# Altium footprint library myPcbLib.PcbLib: 987 footprints (part 2 of 62)
Each footprint in its own frame and in the unit in brackets; x right, y up, seen from the top. Pads: shape width x height; smd on the part's side, far side on the other; paste and mask are expansions set on the pad; w line width, h text height; cw(c..) or ccw(c..) is an arc to the next point about the centre after c.
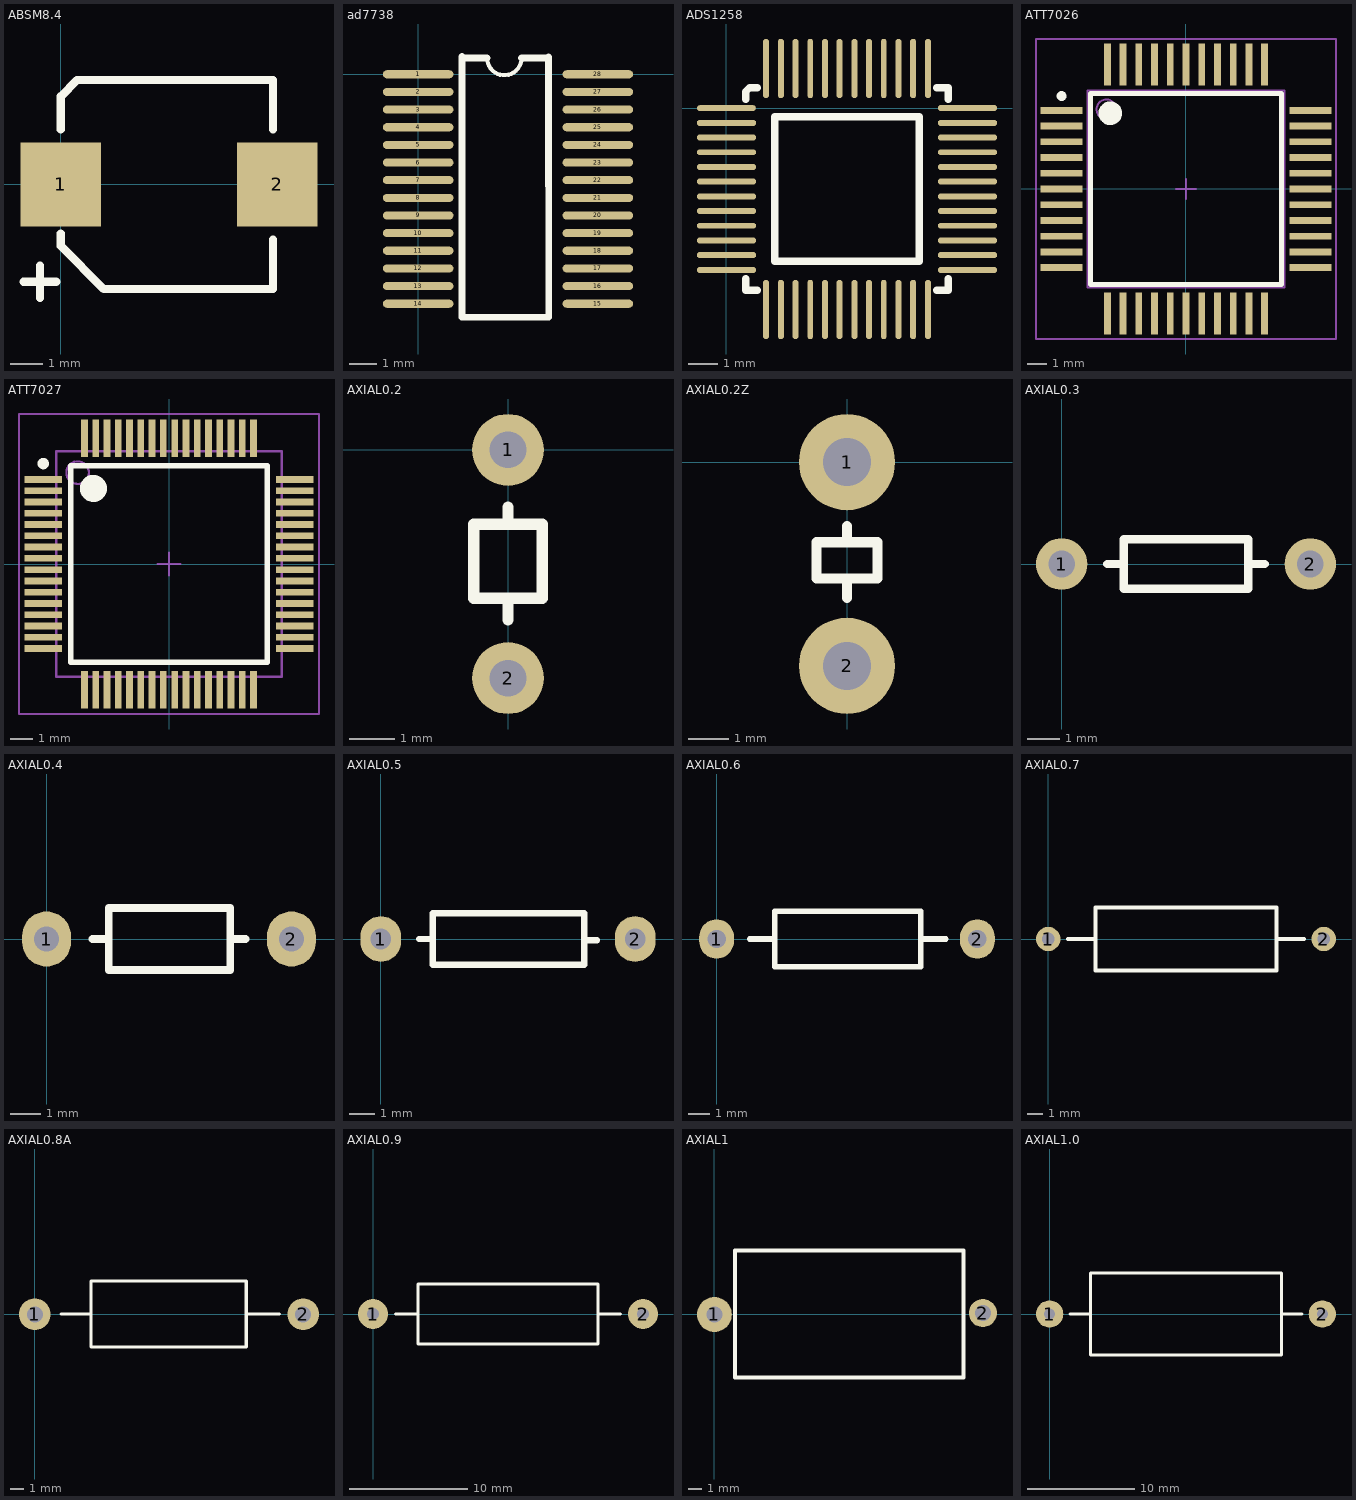
[diagram p1: the footprints below, top view; thin cyan lines are the x and y axes]

## ABSM8.4 [mm]
pads (2):
  rect 2.5x2.6 smd: 1(0,0) 2(6.731,0)
Top Overlay:
  lines w0.254: -1.156,-3.023 -0.648,-3.023 ; -0.648,-3.531 -0.648,-3.023 ; -0.648,-2.515 -0.648,-3.023 ; -0.14,-3.023 -0.648,-3.023 ; 0,-1.524 0,-1.917 1.333,-3.25 6.604,-3.25 6.604,-1.714 ; 0,1.714 0,2.742 0.508,3.25 6.604,3.25 6.604,1.714

## ad7738 [mm]
pads (28):
  oval 2.6x0.3 smd: 1(0,0) 2(0,-0.65) 3(0,-1.3) 4(0,-1.95) 5(0,-2.6) 6(0,-3.25) 7(0,-3.9) 8(0,-4.55) 9(0,-5.2) 10(0,-5.85) 11(0,-6.5) 12(0,-7.15) 13(0,-7.8) 14(0,-8.45) 15(6.616,-8.45) 16(6.616,-7.8) 17(6.616,-7.15) 18(6.616,-6.5) 19(6.616,-5.85) 20(6.616,-5.2) 21(6.616,-4.55) 22(6.616,-3.9) 23(6.616,-3.25) 24(6.616,-2.6) 25(6.616,-1.95) 26(6.616,-1.3) 27(6.616,-0.65) 28(6.616,0)
Top Overlay:
  lines w0.15: 2.538,0.6 ccw(c3.173,0.6) 3.808,0.6
  lines w0.254: 1.608,0.65 1.608,-8.95 4.808,-8.95 4.799,0.635 ; 1.658,0.6 2.538,0.6 ; 3.808,0.6 4.764,0.6

## ADS1258 [mm]
pads (48):
  oval 2x0.2 smd: 1(0,0)
  oct 2x0.2 smd: 2(0,-0.5) 3(0,-1) 4(0,-1.5) 5(0,-2) 6(0,-2.5) 7(0,-3) 8(0,-3.5) 9(0,-4) 10(0,-4.5) 11(0,-5) 12(0,-5.5) 25(8.2,-5.5) 26(8.2,-5) 27(8.2,-4.5) 28(8.2,-4) 29(8.2,-3.5) 30(8.2,-3) 31(8.2,-2.5) 32(8.2,-2) 33(8.2,-1.5) 34(8.2,-1) 35(8.2,-0.5) 36(8.2,0)
  oct 0.2x2 smd: 13(1.35,-6.85) 14(1.85,-6.85) 15(2.35,-6.85) 16(2.85,-6.85) 17(3.35,-6.85) 18(3.85,-6.85) 19(4.35,-6.85) 20(4.85,-6.85) 21(5.35,-6.85) 22(5.85,-6.85) 23(6.35,-6.85) 24(6.85,-6.85) 37(6.85,1.35) 38(6.35,1.35) 39(5.85,1.35) 40(5.35,1.35) 41(4.85,1.35) 42(4.35,1.35) 43(3.85,1.35) 44(3.35,1.35) 45(2.85,1.35) 46(2.35,1.35) 47(1.85,1.35) 48(1.35,1.35)
Top Overlay:
  lines w0.254: 0.65,-5.8 0.65,-6.2 1.05,-6.2 ; 0.65,0.3 0.65,0.55 0.8,0.7 1.05,0.7 ; 7.15,-6.2 7.55,-6.2 7.55,-5.8 ; 7.15,0.7 7.55,0.7 7.55,0.3 ; 1.65,-5.2 6.55,-5.2 6.55,-0.3 1.65,-0.3 1.65,-5.2

## ATT7026 [mm] "QFP, 44-Leads, Body 14.0x14.0mm (max), Pitch 0.80mm, IPC Medium Density"
height 2.7
pads (44):
  rect 2.15x0.35 smd: 1(-6.325,4) 2(-6.325,3.2) 3(-6.325,2.4) 4(-6.325,1.6) 5(-6.325,0.8) 6(-6.325,0) 7(-6.325,-0.8) 8(-6.325,-1.6) 9(-6.325,-2.4) 10(-6.325,-3.2) 11(-6.325,-4) 23(6.325,-4) 24(6.325,-3.2) 25(6.325,-2.4) 26(6.325,-1.6) 27(6.325,-0.8) 28(6.325,0) 29(6.325,0.8) 30(6.325,1.6) 31(6.325,2.4) 32(6.325,3.2) 33(6.325,4)
  rect 0.35x2.15 smd: 12(-4,-6.325) 13(-3.2,-6.325) 14(-2.4,-6.325) 15(-1.6,-6.325) 16(-0.8,-6.325) 17(0,-6.325) 18(0.8,-6.325) 19(1.6,-6.325) 20(2.4,-6.325) 21(3.2,-6.325) 22(4,-6.325) 34(4,6.325) 35(3.2,6.325) 36(2.4,6.325) 37(1.6,6.325) 38(0.8,6.325) 39(0,6.325) 40(-0.8,6.325) 41(-1.6,6.325) 42(-2.4,6.325) 43(-3.2,6.325) 44(-4,6.325)
Top Overlay:
  circle w0.6: c-3.85,3.85 r0.3
  circle w0.25: c-6.325,4.725 r0.125
  lines w0.254: -4.85,-4.85 4.85,-4.85 4.85,4.85 -4.85,4.85 -4.85,-4.85
Mechanical 13:
  circle w0.1: c-4.05,4.05 r0.5
  lines w0.1: -5,-5 5,-5 5,5 -5,5 -5,-5
Mechanical 15:
  lines w0.1: -0.5,0 0.5,0 ; 0,-0.5 0,0.5 ; -7.625,-7.625 7.625,-7.625 7.625,7.625 -7.625,7.625 -7.625,-7.625
3D body: height 2.7, standoff 0.1, extent -5,-5 5,5

## ATT7027 [mm] "TSQFP, 64-Leads, Body 12.0x12.0mm (max), Pitch 0.50mm, IPC Medium Density"
height 1.6
pads (64):
  rect 1.65x0.3 smd: 1(-5.575,3.75) 2(-5.575,3.25) 3(-5.575,2.75) 4(-5.575,2.25) 5(-5.575,1.75) 6(-5.575,1.25) 7(-5.575,0.75) 8(-5.575,0.25) 9(-5.575,-0.25) 10(-5.575,-0.75) 11(-5.575,-1.25) 12(-5.575,-1.75) 13(-5.575,-2.25) 14(-5.575,-2.75) 15(-5.575,-3.25) 16(-5.575,-3.75) 33(5.575,-3.75) 34(5.575,-3.25) 35(5.575,-2.75) 36(5.575,-2.25) 37(5.575,-1.75) 38(5.575,-1.25) 39(5.575,-0.75) 40(5.575,-0.25) 41(5.575,0.25) 42(5.575,0.75) 43(5.575,1.25) 44(5.575,1.75) 45(5.575,2.25) 46(5.575,2.75) 47(5.575,3.25) 48(5.575,3.75)
  rect 0.3x1.65 smd: 17(-3.75,-5.575) 18(-3.25,-5.575) 19(-2.75,-5.575) 20(-2.25,-5.575) 21(-1.75,-5.575) 22(-1.25,-5.575) 23(-0.75,-5.575) 24(-0.25,-5.575) 25(0.25,-5.575) 26(0.75,-5.575) 27(1.25,-5.575) 28(1.75,-5.575) 29(2.25,-5.575) 30(2.75,-5.575) 31(3.25,-5.575) 32(3.75,-5.575) 49(3.75,5.575) 50(3.25,5.575) 51(2.75,5.575) 52(2.25,5.575) 53(1.75,5.575) 54(1.25,5.575) 55(0.75,5.575) 56(0.25,5.575) 57(-0.25,5.575) 58(-0.75,5.575) 59(-1.25,5.575) 60(-1.75,5.575) 61(-2.25,5.575) 62(-2.75,5.575) 63(-3.25,5.575) 64(-3.75,5.575)
Top Overlay:
  circle w0.25: c-5.575,4.45 r0.125
  circle w0.6: c-3.35,3.35 r0.3
  lines w0.254: -4.35,-4.35 -4.35,4.35 4.35,4.35 4.35,-4.35 -4.35,-4.35
Mechanical 1:
  circle w0.1: c-4.05,4.05 r0.5
  lines w0.1: -5,-5 -5,5 5,5 5,-5 -5,-5
Mechanical 15:
  lines w0.1: -0.5,0 0.5,0 ; 0,-0.5 0,0.5 ; -6.65,-6.65 -6.65,6.65 6.65,6.65 6.65,-6.65 -6.65,-6.65
3D body: height 1.6, standoff 0.05, extent -5,-5 5,5

## AXIAL0.2 [mm]
pads (2):
  round 1.6 hole 0.813: 1(0,0) 2(0,-5.08)
Top Overlay:
  lines w0.254: 0,-3.785 0,-3.302 ; 0,-1.499 0,-1.27 ; -0.762,-3.302 -0.762,-1.651 0.762,-1.651 0.762,-3.302 0.254,-3.302 -0.762,-3.302

## AXIAL0.2Z [mm]
pads (2):
  round 2.4 hole 1.2: 1(0,0) 2(0,-5.08)
Top Overlay:
  lines w0.254: 0,-3.385 0,-2.902 ; 0,-1.999 0,-1.6 ; -0.762,-2.9 -0.762,-2 0.762,-2 0.762,-2.9 -0.148,-2.9 -0.762,-2.9

## AXIAL0.3 [mil]
pads (2):
  round 62 hole 32: 1(0,0) 2(300,0)
Top Overlay:
  lines w10: 55,0 70,0 ; 245,0 225,0 ; 225,0 225,30 75,30 75,-30 225,-30 225,0

## AXIAL0.4 [mm]
pads (2):
  oval 1.6x1.8 hole 0.813: 1(0,0) 2(8,0)
Top Overlay:
  lines w0.254: 1.5,0 2.032,0 ; 6,0 6.5,0 ; 2.032,-1.016 6,-1.016 6,1.016 2.032,1.016 2.032,-1.016

## AXIAL0.5 [mm]
pads (2):
  oval 1.6x1.8 hole 0.813: 1(0,0) 2(10,0)
Top Overlay:
  lines w0.254: 1.5,0 2.032,0 ; 8,-0.051 8.5,-0.051 ; 2.032,-1.016 2.032,1.016 8,1.016 8,-1.016 2.032,-1.016

## AXIAL0.6 [mm]
pads (2):
  oval 1.6x1.8 hole 0.85: 1(0,0) 2(12,0)
Top Overlay:
  lines w0.254: 1.524,0 2.667,0 ; 9.398,0 10.541,0 ; 2.667,-1.27 2.667,1.27 9.398,1.27 9.398,-1.27 2.667,-1.27

## AXIAL0.7 [mil]
pads (2):
  round 62 hole 32: 1(0,0) 2(700,0)
Top Overlay:
  lines w10: 50,0 120,0 ; 580,0 650,0 ; 120,-80 580,-80 580,80 120,80 120,-80

## AXIAL0.8A [mm]
pads (2):
  round 2.4 hole 1.2: 1(0,-0.025) 2(20.32,-0.025)
Top Overlay:
  lines w0.254: 2,0 4.25,0 ; 16,0 18.5,0 ; 4.25,-2.5 4.25,2.5 16,2.5 16,-2.5 4.25,-2.5

## AXIAL0.9 [mil]
pads (2):
  round 100 hole 40: 1(0,0) 2(900,0)
Top Overlay:
  lines w10: 75,0 150,0 ; 750,0 825,0 ; 150,-100 150,100 750,100 750,-100 150,-100

## AXIAL1 [mm]
pads (2):
  round 2.6 hole 1.2: 1(0,0)
  round 2.1 hole 1.2: 2(20.013,0.106)
Top Overlay:
  lines w0.305: 18.553,-4.71 1.535,-4.71 1.535,4.784 18.574,4.784 18.574,-4.635

## AXIAL1.0 [mil]
pads (2):
  round 100 hole 40: 1(0,0) 2(1000,0)
Top Overlay:
  lines w10: 75,0 150,0 ; 850,0 925,0 ; 150,-150 850,-150 850,150 150,150 150,-150